# Altium footprint library WR-DSUB_Female.PcbLib: 32 footprints (part 1 of 2)
Each footprint in its own frame and in the unit in brackets; x right, y up, seen from the top. Pads: shape width x height; smd on the part's side, far side on the other; paste and mask are expansions set on the pad; w line width, h text height; cw(c..) or ccw(c..) is an arc to the next point about the centre after c.
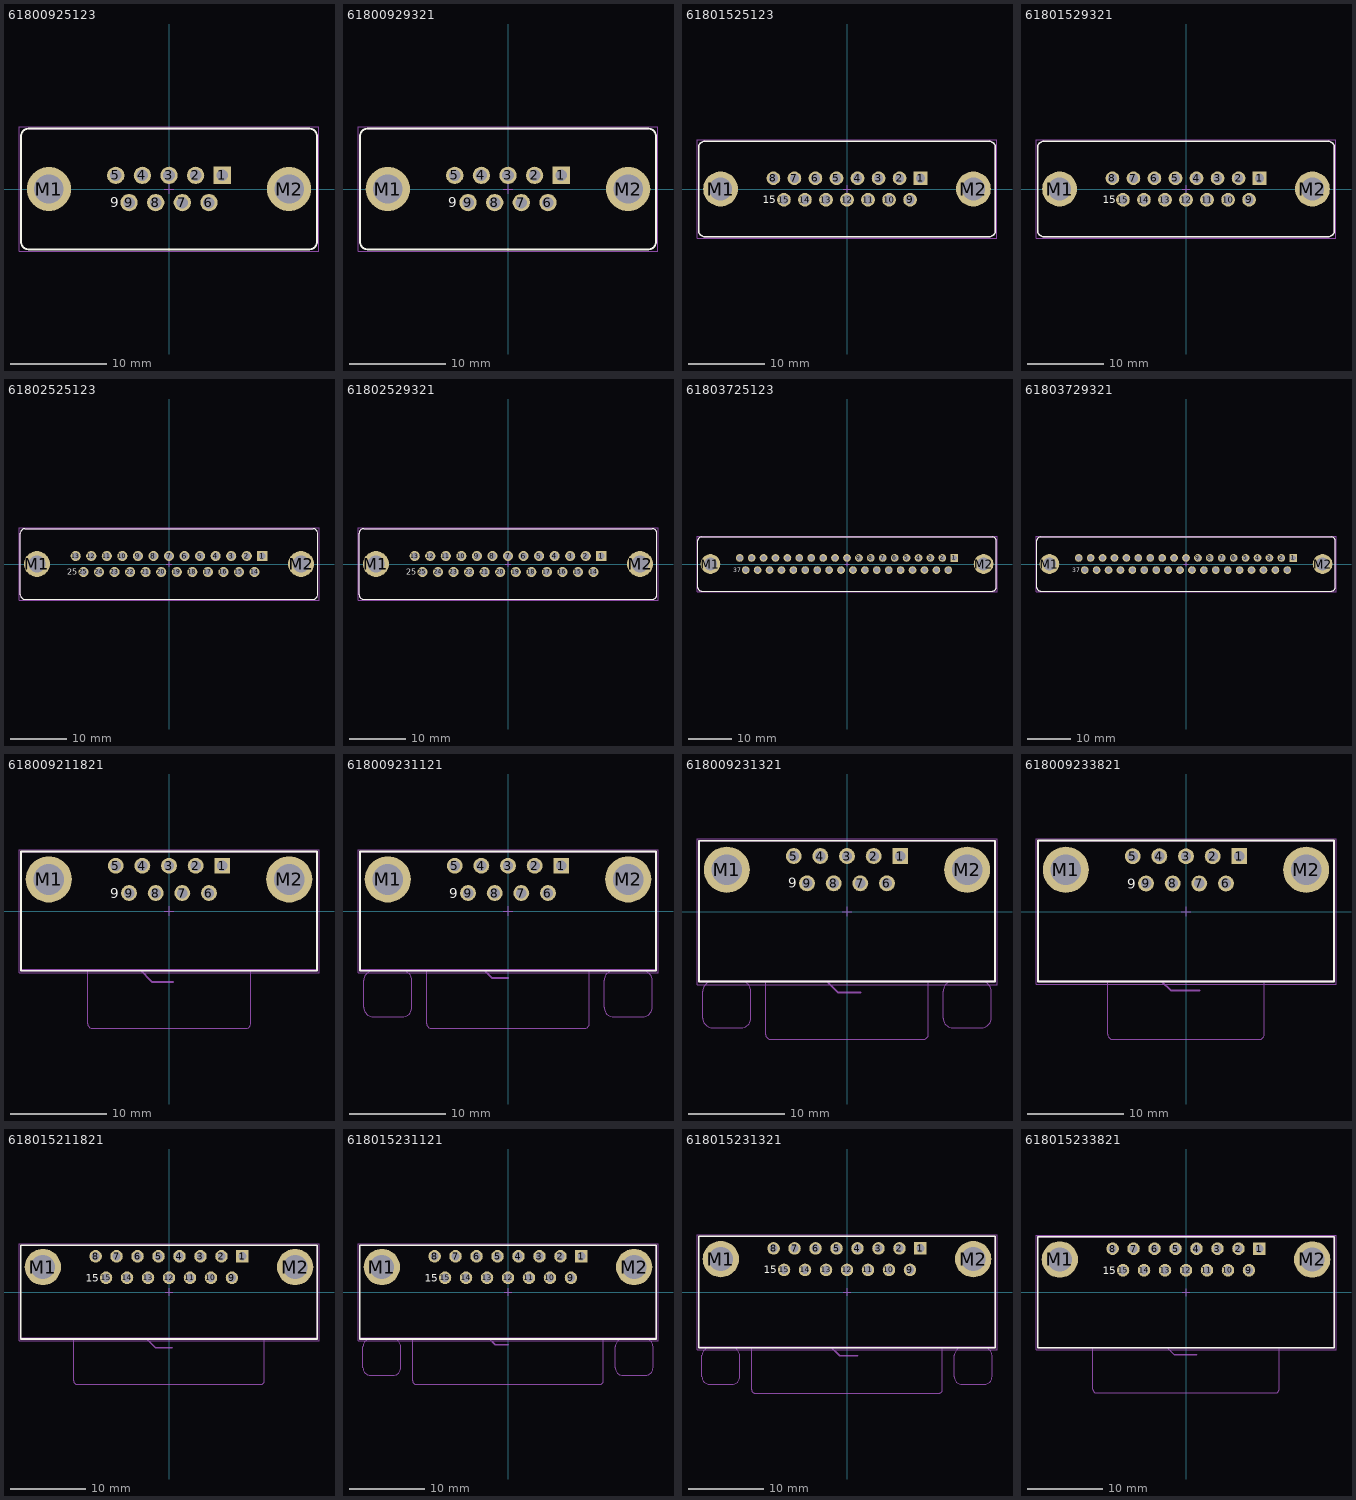
[diagram p0: the footprints below, top view; thin cyan lines are the x and y axes]

## 61800925123 [mm] "9 pins, straight"
height 10.7
pads (11):
  rect 1.8x1.8 hole 1.2: 1(5.54,1.42)
  round 1.8 hole 1.2: 2(2.77,1.42) 3(0,1.42) 4(-2.77,1.42) 5(-5.54,1.42) 6(4.155,-1.42) 7(1.385,-1.42) 8(-1.385,-1.42) 9(-4.155,-1.42)
  round 4.6 hole 3.05: M1(-12.495,0) M2(12.495,0)
Top Overlay:
  lines w0.2: -15.405,5.425 -15.405,-5.475 ccw(c-14.605,-5.475) -14.605,-6.275 14.605,-6.275 ccw(c14.605,-5.475) 15.405,-5.475 15.405,5.425 ; -15.405,5.475 cw(c-14.605,5.475) -14.605,6.275 14.605,6.275 cw(c14.605,5.475) 15.405,5.475
  text "9" at -6.1,-1.9 h1.02
Mechanical 13:
  lines w0.1: -15.405,5.425 -15.405,-5.475 ccw(c-14.605,-5.475) -14.605,-6.275 14.605,-6.275 ccw(c14.605,-5.475) 15.405,-5.475 15.405,5.425 ; -15.405,5.475 cw(c-14.605,5.475) -14.605,6.275 14.605,6.275 cw(c14.605,5.475) 15.405,5.475
Mechanical 15:
  lines w0.05: -0.5,0 0.5,0 ; 0,-0.5 0,0.5 ; -15.605,-6.475 -15.605,6.475 15.605,6.475 15.605,-6.475 -15.605,-6.475
3D body "61800925123.stp": height 12.95, standoff -3.8, extent -15.4,-6.275 15.4,6.275

## 61800929321 [mm] "Female 09p Straight With board clip & Hex screw UNC 4-40"
height 11
pads (11):
  rect 1.8x1.8 hole 1.2: 1(5.54,1.42)
  round 1.8 hole 1.2: 2(2.77,1.42) 3(0,1.42) 4(-2.77,1.42) 5(-5.54,1.42) 6(4.155,-1.42) 7(1.385,-1.42) 8(-1.385,-1.42) 9(-4.155,-1.42)
  round 4.6 hole 3.05: M1(-12.5,0) M2(12.5,0)
Top Overlay:
  lines w0.2: -15.405,-5.475 ccw(c-14.605,-5.475) -14.605,-6.275 14.605,-6.275 ccw(c14.605,-5.475) 15.405,-5.475 15.405,5.475 ccw(c14.605,5.475) 14.605,6.275 -14.605,6.275 ccw(c-14.605,5.475) -15.405,5.475 -15.405,-5.475
  text "9" at -6.2,-1.9 h1.02
Mechanical 13:
  lines w0.1: -15.405,-5.475 ccw(c-14.605,-5.475) -14.605,-6.275 14.605,-6.275 ccw(c14.605,-5.475) 15.405,-5.475 15.405,5.475 ccw(c14.605,5.475) 14.605,6.275 -14.605,6.275 ccw(c-14.605,5.475) -15.405,5.475 -15.405,-5.475
Mechanical 15:
  lines w0.05: -0.5,0 0.5,0 ; 0,-0.5 0,0.5 ; -15.605,-6.475 -15.605,6.475 15.605,6.475 15.605,-6.475 -15.605,-6.475
3D body "61800929321.stp": height 12.9, standoff -3.9, extent -15.4,-6.275 15.4,6.275

## 61801525123 [mm] "15 pins, straight"
height 10.7
pads (17):
  rect 1.8x1.8 hole 1.2: 1(9.695,1.42)
  round 1.8 hole 1.2: 2(6.925,1.42) 3(4.155,1.42) 4(1.385,1.42) 5(-1.385,1.42) 6(-4.155,1.42) 7(-6.925,1.42) 8(-9.695,1.42) 9(8.31,-1.42) 10(5.54,-1.42) 11(2.77,-1.42) 12(0,-1.42) 13(-2.77,-1.42) 14(-5.54,-1.42) 15(-8.31,-1.42)
  round 4.6 hole 3.05: M1(-16.66,0) M2(16.66,0)
Top Overlay:
  lines w0.2: -19.56,5.425 -19.56,-5.475 ccw(c-18.76,-5.475) -18.76,-6.275 18.76,-6.275 ccw(c18.76,-5.475) 19.56,-5.475 19.56,5.425 ; -19.56,5.475 cw(c-18.76,5.475) -18.76,6.275 18.76,6.275 cw(c18.76,5.475) 19.56,5.475
  text "15" at -11.1,-1.9 h1.02
Mechanical 13:
  lines w0.1: -19.56,-5.475 ccw(c-18.76,-5.475) -18.76,-6.275 18.76,-6.275 ccw(c18.76,-5.475) 19.56,-5.475 19.56,5.475 ccw(c18.76,5.475) 18.76,6.275 -18.76,6.275 ccw(c-18.76,5.475) -19.56,5.475 -19.56,-5.475
Mechanical 15:
  lines w0.05: -0.5,0 0.5,0 ; 0,-0.5 0,0.5 ; -19.77,-6.475 -19.77,6.475 19.77,6.475 19.77,-6.475 -19.77,-6.475
3D body "61801525123.stp": height 12.95, standoff -3.8, extent -19.6,-6.275 19.6,6.275

## 61801529321 [mm] "Female 15p Straight With board clip & Hex screw UNC 4-40"
height 11
pads (17):
  rect 1.8x1.8 hole 1.2: 1(9.695,1.42)
  round 1.8 hole 1.2: 2(6.925,1.42) 3(4.155,1.42) 4(1.385,1.42) 5(-1.385,1.42) 6(-4.155,1.42) 7(-6.925,1.42) 8(-9.695,1.42) 9(8.31,-1.42) 10(5.54,-1.42) 11(2.77,-1.42) 12(0,-1.42) 13(-2.77,-1.42) 14(-5.54,-1.42) 15(-8.31,-1.42)
  round 4.6 hole 3.05: M1(-16.66,0) M2(16.66,0)
Top Overlay:
  lines w0.2: -19.57,-5.475 ccw(c-18.77,-5.475) -18.77,-6.275 18.77,-6.275 ccw(c18.77,-5.475) 19.57,-5.475 19.57,5.475 ccw(c18.77,5.475) 18.77,6.275 -18.77,6.275 ccw(c-18.77,5.475) -19.57,5.475 -19.57,-5.475
  text "15" at -11,-1.9 h1.02
Mechanical 13:
  lines w0.1: -19.57,-5.475 ccw(c-18.77,-5.475) -18.77,-6.275 18.77,-6.275 ccw(c18.77,-5.475) 19.57,-5.475 19.57,5.475 ccw(c18.77,5.475) 18.77,6.275 -18.77,6.275 ccw(c-18.77,5.475) -19.57,5.475 -19.57,-5.475
Mechanical 15:
  lines w0.05: -0.5,0 0.5,0 ; 0,-0.5 0,0.5 ; -19.77,-6.475 -19.77,6.475 19.77,6.475 19.77,-6.475 -19.77,-6.475
3D body "61801529321.stp": height 12.9, standoff -3.9, extent -19.6,-6.275 19.6,6.275

## 61802525123 [mm] "25 pins, straight"
height 10.7
pads (27):
  rect 1.8x1.8 hole 1.2: 1(16.62,1.42)
  round 1.8 hole 1.2: 2(13.85,1.42) 3(11.08,1.42) 4(8.31,1.42) 5(5.54,1.42) 6(2.77,1.42) 7(0,1.42) 8(-2.77,1.42) 9(-5.54,1.42) 10(-8.31,1.42) 11(-11.08,1.42) 12(-13.85,1.42) 13(-16.62,1.42) 14(15.235,-1.42) 15(12.465,-1.42) 16(9.695,-1.42) 17(6.925,-1.42) 18(4.155,-1.42) 19(1.385,-1.42) 20(-1.385,-1.42) 21(-4.155,-1.42) 22(-6.925,-1.42) 23(-9.695,-1.42) 24(-12.465,-1.42) 25(-15.235,-1.42)
  round 4.6 hole 3.05: M1(-23.52,0) M2(23.52,0)
Top Overlay:
  lines w0.2: -26.485,-5.475 ccw(c-25.685,-5.475) -25.685,-6.275 25.685,-6.275 ccw(c25.685,-5.475) 26.485,-5.475 26.485,5.475 ccw(c25.685,5.475) 25.685,6.275 -25.685,6.275 ccw(c-25.685,5.475) -26.485,5.475 -26.485,-5.475
  text "25" at -18.1,-1.9 h1.02
Mechanical 13:
  lines w0.1: -26.485,-5.475 ccw(c-25.685,-5.475) -25.685,-6.275 25.685,-6.275 ccw(c25.685,-5.475) 26.485,-5.475 26.485,5.475 ccw(c25.685,5.475) 25.685,6.275 -25.685,6.275 ccw(c-25.685,5.475) -26.485,5.475 -26.485,-5.475
Mechanical 15:
  lines w0.05: -0.5,0 0.5,0 ; 0,-0.5 0,0.5 ; -26.72,-6.475 26.72,-6.475 26.72,6.475 -26.72,6.475 -26.72,-6.475
3D body "61802525123.stp": height 12.95, standoff -3.8, extent -26.525,-6.275 26.525,6.275

## 61802529321 [mm] "Female 25p Straight With board clip & Hex screw UNC 4-40"
height 11
pads (27):
  rect 1.8x1.8 hole 1.2: 1(16.62,1.42)
  round 1.8 hole 1.2: 2(13.85,1.42) 3(11.08,1.42) 4(8.31,1.42) 5(5.54,1.42) 6(2.77,1.42) 7(0,1.42) 8(-2.77,1.42) 9(-5.54,1.42) 10(-8.31,1.42) 11(-11.08,1.42) 12(-13.85,1.42) 13(-16.62,1.42) 14(15.235,-1.42) 15(12.465,-1.42) 16(9.695,-1.42) 17(6.925,-1.42) 18(4.155,-1.42) 19(1.385,-1.42) 20(-1.385,-1.42) 21(-4.155,-1.42) 22(-6.925,-1.42) 23(-9.695,-1.42) 24(-12.465,-1.42) 25(-15.235,-1.42)
  round 4.6 hole 3.05: M1(-23.52,0) M2(23.52,0)
Top Overlay:
  lines w0.2: -26.52,-5.475 ccw(c-25.72,-5.475) -25.72,-6.275 25.72,-6.275 ccw(c25.72,-5.475) 26.52,-5.475 26.52,5.475 ccw(c25.72,5.475) 25.72,6.275 -25.72,6.275 ccw(c-25.72,5.475) -26.52,5.475 -26.52,-5.475
  text "25" at -18.1,-1.9 h1.02
Mechanical 13:
  lines w0.1: -26.52,-5.475 ccw(c-25.72,-5.475) -25.72,-6.275 25.72,-6.275 ccw(c25.72,-5.475) 26.52,-5.475 26.52,5.475 ccw(c25.72,5.475) 25.72,6.275 -25.72,6.275 ccw(c-25.72,5.475) -26.52,5.475 -26.52,-5.475
Mechanical 15:
  lines w0.05: -0.5,0 0.5,0 ; 0,-0.5 0,0.5 ; -26.72,-6.475 -26.72,6.475 26.72,6.475 26.72,-6.475 -26.72,-6.475
3D body "61802529321.stp": height 12.9, standoff -3.9, extent -26.525,-6.275 26.525,6.275

## 61803725123 [mm] "37 pins, straight"
height 10.7
pads (39):
  rect 1.8x1.8 hole 1.2: 1(24.93,1.42)
  round 1.8 hole 1.2: 2(22.16,1.42) 3(19.39,1.42) 4(16.62,1.42) 5(13.85,1.42) 6(11.08,1.42) 7(8.31,1.42) 8(5.54,1.42) 9(2.77,1.42) 10(0,1.42) 11(-2.77,1.42) 12(-5.54,1.42) 13(-8.31,1.42) 14(-11.08,1.42) 15(-13.85,1.42) 16(-16.62,1.42) 17(-19.39,1.42) 18(-22.16,1.42) 19(-24.93,1.42) 20(23.545,-1.42) 21(20.775,-1.42) 22(18.005,-1.42) 23(15.235,-1.42) 24(12.465,-1.42) 25(9.695,-1.42) 26(6.925,-1.42) 27(4.155,-1.42) 28(1.385,-1.42) 29(-1.385,-1.42) 30(-4.155,-1.42) 31(-6.925,-1.42) 32(-9.695,-1.42) 33(-12.465,-1.42) 34(-15.235,-1.42) 35(-18.005,-1.42) 36(-20.775,-1.42) 37(-23.545,-1.42)
  round 4.6 hole 3.05: M1(-31.75,0) M2(31.75,0)
Top Overlay:
  lines w0.2: -34.66,-5.475 ccw(c-33.86,-5.475) -33.86,-6.275 33.86,-6.275 ccw(c33.86,-5.475) 34.66,-5.475 34.66,5.475 ccw(c33.86,5.475) 33.86,6.275 -33.86,6.275 ccw(c-33.86,5.475) -34.66,5.475 -34.66,-5.475
  text "37" at -26.41,-1.9 h1.02
Mechanical 13:
  lines w0.1: -34.66,-5.475 ccw(c-33.86,-5.475) -33.86,-6.275 33.86,-6.275 ccw(c33.86,-5.475) 34.66,-5.475 34.66,5.475 ccw(c33.86,5.475) 33.86,6.275 -33.86,6.275 ccw(c-33.86,5.475) -34.66,5.475 -34.66,-5.475
Mechanical 15:
  lines w0.05: -0.5,0 0.5,0 ; 0,-0.5 0,0.5 ; -34.86,-6.475 34.86,-6.475 34.86,6.475 -34.86,6.475 -34.86,-6.475
3D body "61803725123.stp": height 12.95, standoff -3.8, extent -34.7,-6.275 34.7,6.275

## 61803729321 [mm] "Female 37p Straight With board clip & Hex screw UNC 4-40"
height 11
pads (39):
  rect 1.8x1.8 hole 1.2: 1(24.93,1.42)
  round 1.8 hole 1.2: 2(22.16,1.42) 3(19.39,1.42) 4(16.62,1.42) 5(13.85,1.42) 6(11.08,1.42) 7(8.31,1.42) 8(5.54,1.42) 9(2.77,1.42) 10(0,1.42) 11(-2.77,1.42) 12(-5.54,1.42) 13(-8.31,1.42) 14(-11.08,1.42) 15(-13.85,1.42) 16(-16.62,1.42) 17(-19.39,1.42) 18(-22.16,1.42) 19(-24.93,1.42) 20(23.545,-1.42) 21(20.775,-1.42) 22(18.005,-1.42) 23(15.235,-1.42) 24(12.465,-1.42) 25(9.695,-1.42) 26(6.925,-1.42) 27(4.155,-1.42) 28(1.385,-1.42) 29(-1.385,-1.42) 30(-4.155,-1.42) 31(-6.925,-1.42) 32(-9.695,-1.42) 33(-12.465,-1.42) 34(-15.235,-1.42) 35(-18.005,-1.42) 36(-20.775,-1.42) 37(-23.545,-1.42)
  round 4.6 hole 3.05: M1(-31.75,0) M2(31.75,0)
Top Overlay:
  lines w0.2: -34.66,-5.475 ccw(c-33.86,-5.475) -33.86,-6.275 33.86,-6.275 ccw(c33.86,-5.475) 34.66,-5.475 34.66,5.475 ccw(c33.86,5.475) 33.86,6.275 -33.86,6.275 ccw(c-33.86,5.475) -34.66,5.475 -34.66,-5.475
  text "37" at -26.41,-1.9 h1.02
Mechanical 13:
  lines w0.1: -34.66,-5.475 ccw(c-33.86,-5.475) -33.86,-6.275 33.86,-6.275 ccw(c33.86,-5.475) 34.66,-5.475 34.66,5.475 ccw(c33.86,5.475) 33.86,6.275 -33.86,6.275 ccw(c-33.86,5.475) -34.66,5.475 -34.66,-5.475
Mechanical 15:
  lines w0.05: -0.5,0 0.5,0 ; 0,-0.5 0,0.5 ; -34.86,-6.475 34.86,-6.475 34.86,6.475 -34.86,6.475 -34.86,-6.475
3D body "61803729321.stp": height 12.9, standoff -3.9, extent -34.7,-6.275 34.7,6.275

## 618009211821 [mm] "09p 8.08mm bracket, board lock & UNC4-40 Rivet without hex screw"
height 12.5
pads (11):
  rect 1.65x1.65 hole 1.09: 1(5.54,4.72)
  round 1.65 hole 1.09: 2(2.77,4.72) 3(0,4.72) 4(-2.77,4.72) 5(-5.54,4.72) 6(4.155,1.88) 7(1.385,1.88) 8(-1.385,1.88) 9(-4.155,1.88)
  round 4.8 hole 3.2: M1(-12.5,3.3) M2(12.5,3.3)
Top Overlay:
  lines w0.2: -15.4,-6.2 15.4,-6.2 15.4,6.2 -15.4,6.2 -15.4,-6.2
  text "9" at -6.1,1.35 h1.02
Mechanical 2:
  lines w0.2: -15.4,-6.12 15.4,-6.12 ; -3,-6.12 -1.77,-7.35 0.4,-7.35
  text "PCB Edge" at 0.7,-8.05 h1.02
Mechanical 13:
  lines w0.1: -8.45,-6.2 -8.45,-11.7 ccw(c-7.95,-11.7) -7.95,-12.2 ; -8,-12.2 8,-12.2 ccw(c8,-11.7) 8.5,-11.7 8.5,-6.2 ; -15.4,-6.2 -15.4,6.2 15.4,6.2 15.4,-6.2 -15.4,-6.2
Mechanical 15:
  lines w0.05: -0.5,0 0.5,0 ; 0,-0.5 0,0.5 ; -15.6,-6.4 -15.6,6.4 15.6,6.4 15.6,-6.4 -15.6,-6.4
3D body "618009211821.stp": height 12.55, standoff -3.95, extent -15.4,-12.2 15.4,6.2

## 618009231121 [mm] "9 pins, right angled, 8.08mm, with hex screw"
height 12.5
pads (11):
  rect 1.65x1.65 hole 1.09: 1(5.54,4.72)
  round 1.65 hole 1.09: 2(2.77,4.72) 3(0,4.72) 4(-2.77,4.72) 5(-5.54,4.72) 6(4.155,1.88) 7(1.385,1.88) 8(-1.385,1.88) 9(-4.155,1.88)
  round 4.8 hole 3.2: M1(-12.5,3.3) M2(12.5,3.3)
Top Overlay:
  lines w0.2: -15.4,-6.2 -15.4,6.2 15.4,6.2 15.4,-6.2 -15.4,-6.2
  text "9" at -6.1,1.35 h1.02
Mechanical 2:
  lines w0.2: -15.4,-6.12 15.4,-6.12 ; -2.5,-6.12 -1.67,-6.95 0,-6.95
  text "PCB Edge" at 0.4,-7.55 h1.02
Mechanical 13:
  lines w0.1: -14,-6.2 ccw(c-14,-7.2) -15,-7.2 -15,-10 ccw(c-14,-10) -14,-11 -11,-11 ccw(c-11,-10) -10,-10 -10,-7.2 ccw(c-11,-7.2) -11,-6.2 ; -8.45,-6.2 -8.45,-11.7 ccw(c-7.95,-11.7) -7.95,-12.2 7.95,-12.2 ; 8.45,-6.2 8.45,-11.7 cw(c7.95,-11.7) 7.95,-12.2 ; 11,-6.2 ccw(c11,-7.2) 10,-7.2 10,-10 ccw(c11,-10) 11,-11 14,-11 ccw(c14,-10) 15,-10 15,-7.2 ccw(c14,-7.2) 14,-6.2 ; 7.95,-12.2 7.95,-12.2 ; -15.4,-6.2 15.4,-6.2 15.4,6.2 -15.4,6.2 -15.4,-6.2
Mechanical 15:
  lines w0.05: -0.5,0 0.5,0 ; 0,-0.5 0,0.5 ; -15.6,-6.4 -15.6,6.4 15.6,6.4 15.6,-6.4 -15.6,-6.4
3D body "618009231121.stp": height 12.55, standoff -3.95, extent -15.4,-12.2 15.4,6.2

## 618009231321 [mm] "9 pins, right angled, 10.3mm, with hex screw"
height 12.5
pads (11):
  rect 1.65x1.65 hole 1.09: 1(5.54,5.78)
  round 1.65 hole 1.09: 2(2.77,5.78) 3(0,5.78) 4(-2.77,5.78) 5(-5.54,5.78) 6(4.155,2.94) 7(1.385,2.94) 8(-1.385,2.94) 9(-4.155,2.94)
  round 4.8 hole 3.2: M1(-12.495,4.36) M2(12.495,4.36)
Top Overlay:
  lines w0.2: -15.4,-7.28 -15.4,7.37 15.4,7.37 15.4,-7.28 -15.4,-7.28
  text "9" at -6.1,2.5 h1.02
Mechanical 2:
  lines w0.2: -15.4,-7.26 15.4,-7.26 ; -2.1,-7.26 -0.96,-8.4 1.4,-8.4
  text "PCB Edge" at 1.8,-8.8 h1.02
Mechanical 13:
  lines w0.1: -14,-7.28 ccw(c-14,-8.28) -15,-8.28 -15,-11.08 ccw(c-14,-11.08) -14,-12.08 -11,-12.08 ccw(c-11,-11.08) -10,-11.08 -10,-8.28 ccw(c-11,-8.28) -11,-7.28 ; -8.45,-7.28 -8.45,-12.78 ccw(c-7.95,-12.78) -7.95,-13.28 7.95,-13.28 ; 8.45,-7.28 8.45,-12.78 cw(c7.95,-12.78) 7.95,-13.28 ; 11,-7.28 ccw(c11,-8.28) 10,-8.28 10,-11.08 ccw(c11,-11.08) 11,-12.08 14,-12.08 ccw(c14,-11.08) 15,-11.08 15,-8.28 ccw(c14,-8.28) 14,-7.28 ; 7.95,-13.28 7.95,-13.28 ; -15.4,-7.28 15.4,-7.28 15.4,7.37 -15.4,7.37 -15.4,-7.28
Mechanical 15:
  lines w0.05: -0.5,0 0.5,0 ; 0,-0.5 0,0.5 ; -15.6,-7.59 15.6,-7.59 15.6,7.59 -15.6,7.59 -15.6,-7.59
3D body "618009231321.stp": height 12.57, standoff -3.77, extent -15.408,-13.28 15.408,7.37

## 618009233821 [mm] "09p 10.3mm bracket, board lock & UNC4-40 Rivet without hex screw"
height 12.5
pads (11):
  rect 1.65x1.65 hole 1.09: 1(5.54,5.765)
  round 1.65 hole 1.09: 2(2.77,5.765) 3(0,5.765) 4(-2.77,5.765) 5(-5.54,5.765) 6(4.155,2.925) 7(1.385,2.925) 8(-1.385,2.925) 9(-4.155,2.925)
  round 4.8 hole 3.2: M1(-12.495,4.345) M2(12.495,4.345)
Top Overlay:
  lines w0.2: -15.4,-7.275 15.4,-7.275 15.4,7.375 -15.4,7.375 -15.4,-7.275
  text "9" at -6.1,2.4 h1.02
Mechanical 2:
  lines w0.2: -15.4,-7.275 15.4,-7.275 ; -2.5,-7.275 -1.575,-8.2 1.4,-8.2
  text "PCB Edge" at 1.8,-8.7 h1.02
Mechanical 13:
  lines w0.1: -8.15,-7.275 -8.15,-12.775 ccw(c-7.65,-12.775) -7.65,-13.275 7.65,-13.275 ; 8.15,-7.275 8.15,-12.775 cw(c7.65,-12.775) 7.65,-13.275 ; 7.65,-13.275 7.65,-13.275 ; -15.4,-7.275 -15.4,7.375 15.4,7.375 15.4,-7.275 -15.4,-7.275
Mechanical 15:
  lines w0.05: -0.5,0 0.5,0 ; 0,-0.5 0,0.5 ; -15.6,-7.575 -15.6,7.575 15.6,7.575 15.6,-7.575 -15.6,-7.575
3D body "618009233821.stp": height 12.57, standoff -3.77, extent -15.408,-13.275 15.408,7.375

## 618015211821 [mm] "15p 8.08mm bracket, board lock & UNC4-40 Rivet without hex screw"
height 12.5
pads (17):
  rect 1.65x1.65 hole 1.09: 1(9.695,4.72)
  round 1.65 hole 1.09: 2(6.925,4.72) 3(4.155,4.72) 4(1.385,4.72) 5(-1.385,4.72) 6(-4.155,4.72) 7(-6.925,4.72) 8(-9.695,4.72) 9(8.31,1.88) 10(5.54,1.88) 11(2.77,1.88) 12(0,1.88) 13(-2.77,1.88) 14(-5.54,1.88) 15(-8.31,1.88)
  round 4.8 hole 3.2: M1(-16.65,3.3) M2(16.65,3.3)
Top Overlay:
  lines w0.2: -19.6,-6.2 19.6,-6.2 19.6,6.2 -19.6,6.2 -19.6,-6.2
  text "15" at -11,1.35 h1.02
Mechanical 2:
  lines w0.2: -19.6,-6.12 19.6,-6.12 ; -3,-6.12 -1.77,-7.35 0.4,-7.35
  text "PCB Edge" at 0.7,-8.05 h1.02
Mechanical 13:
  lines w0.1: -12.6,-6.2 -12.6,-11.7 ccw(c-12.1,-11.7) -12.1,-12.2 ; -12.15,-12.2 12.1,-12.2 ccw(c12.1,-11.7) 12.6,-11.7 12.6,-6.2 ; -19.6,-6.2 -19.6,6.2 19.6,6.2 19.6,-6.2 -19.6,-6.2
Mechanical 15:
  lines w0.05: -0.5,0 0.5,0 ; 0,-0.5 0,0.5 ; -19.8,-6.4 19.8,-6.4 19.8,6.4 -19.8,6.4 -19.8,-6.4
3D body "618015211821.stp": height 12.55, standoff -3.95, extent -19.6,-12.2 19.6,6.2

## 618015231121 [mm] "15 pins, right angled, 8.08mm, with hex screw"
height 12.5
pads (17):
  rect 1.65x1.65 hole 1.09: 1(9.695,4.72)
  round 1.65 hole 1.09: 2(6.925,4.72) 3(4.155,4.72) 4(1.385,4.72) 5(-1.385,4.72) 6(-4.155,4.72) 7(-6.925,4.72) 8(-9.695,4.72) 9(8.31,1.88) 10(5.54,1.88) 11(2.77,1.88) 12(0,1.88) 13(-2.77,1.88) 14(-5.54,1.88) 15(-8.31,1.88)
  round 4.8 hole 3.2: M1(-16.65,3.3) M2(16.65,3.3)
Top Overlay:
  lines w0.2: -19.6,-6.2 19.6,-6.2 19.6,6.2 -19.6,6.2 -19.6,-6.2
  text "15" at -11,1.35 h1.02
Mechanical 2:
  lines w0.2: -19.6,-6.12 19.6,-6.12 ; -2.5,-6.12 -1.67,-6.95 0,-6.95
  text "PCB Edge" at 0.4,-7.55 h1.02
Mechanical 13:
  lines w0.1: -18.15,-6.2 ccw(c-18.15,-7.2) -19.15,-7.2 -19.15,-10 ccw(c-18.15,-10) -18.15,-11 -15.15,-11 ccw(c-15.15,-10) -14.15,-10 -14.15,-7.2 ccw(c-15.15,-7.2) -15.15,-6.2 ; -12.6,-6.2 -12.6,-11.7 ccw(c-12.1,-11.7) -12.1,-12.2 12.1,-12.2 ccw(c12.1,-11.7) 12.6,-11.7 12.6,-6.2 ; 15.15,-6.2 ccw(c15.15,-7.2) 14.15,-7.2 14.15,-10 ccw(c15.15,-10) 15.15,-11 18.15,-11 ccw(c18.15,-10) 19.15,-10 19.15,-7.2 ccw(c18.15,-7.2) 18.15,-6.2 ; -19.6,-6.2 19.6,-6.2 19.6,6.2 -19.6,6.2 -19.6,-6.2 ; 3.8,-12.2 3.8,-12.2
Mechanical 15:
  lines w0.05: -0.5,0 0.5,0 ; 0,-0.5 0,0.5 ; -19.8,-6.4 -19.8,6.4 19.8,6.4 19.8,-6.4 -19.8,-6.4
3D body "618015231121.stp": height 12.55, standoff -3.95, extent -19.6,-12.2 19.6,6.2

## 618015231321 [mm] "15 pins, right angled, 10.3mm, with hex screw"
height 12.5
pads (17):
  rect 1.65x1.65 hole 1.09: 1(9.695,5.78)
  round 1.65 hole 1.09: 2(6.925,5.78) 3(4.155,5.78) 4(1.385,5.78) 5(-1.385,5.78) 6(-4.155,5.78) 7(-6.925,5.78) 8(-9.695,5.78) 9(8.31,2.94) 10(5.54,2.94) 11(2.77,2.94) 12(0,2.94) 13(-2.77,2.94) 14(-5.54,2.94) 15(-8.31,2.94)
  round 4.8 hole 3.2: M1(-16.66,4.36) M2(16.66,4.36)
Top Overlay:
  lines w0.2: -19.6,-7.36 -19.6,7.37 19.6,7.37 19.6,-7.36 -19.6,-7.36
  text "15" at -11,2.5 h1.02
Mechanical 2:
  lines w0.2: -19.6,-7.26 19.6,-7.26 ; -2.1,-7.26 -0.96,-8.4 1.4,-8.4
  text "PCB Edge" at 1.8,-8.8 h1.02
Mechanical 13:
  lines w0.1: -18.15,-7.36 ccw(c-18.15,-8.36) -19.15,-8.36 -19.15,-11.16 ccw(c-18.15,-11.16) -18.15,-12.16 -15.15,-12.16 ccw(c-15.15,-11.16) -14.15,-11.16 -14.15,-8.36 ccw(c-15.15,-8.36) -15.15,-7.36 ; -12.6,-7.36 -12.6,-12.86 ccw(c-12.1,-12.86) -12.1,-13.36 12.1,-13.36 ; 12.6,-7.36 12.6,-12.86 cw(c12.1,-12.86) 12.1,-13.36 ; 15.15,-7.36 ccw(c15.15,-8.36) 14.15,-8.36 14.15,-11.16 ccw(c15.15,-11.16) 15.15,-12.16 18.15,-12.16 ccw(c18.15,-11.16) 19.15,-11.16 19.15,-8.36 ccw(c18.15,-8.36) 18.15,-7.36 ; 12.1,-13.36 12.1,-13.36 ; -19.6,-7.36 19.6,-7.36 19.6,7.37 -19.6,7.37 -19.6,-7.36
Mechanical 15:
  lines w0.05: -0.5,0 0.5,0 ; 0,-0.5 0,0.5 ; -19.8,-7.59 19.8,-7.59 19.8,7.59 -19.8,7.59 -19.8,-7.59
3D body "618015231321.stp": height 12.57, standoff -3.77, extent -19.575,-13.28 19.575,7.37

## 618015233821 [mm] "15p 10.3mm bracket, board lock & UNC4-40 Rivet without hex screw"
height 12.5
pads (17):
  rect 1.65x1.65 hole 1.09: 1(9.695,5.765)
  round 1.65 hole 1.09: 2(6.925,5.765) 3(4.155,5.765) 4(1.385,5.765) 5(-1.385,5.765) 6(-4.155,5.765) 7(-6.925,5.765) 8(-9.695,5.765) 9(8.31,2.925) 10(5.54,2.925) 11(2.77,2.925) 12(0,2.925) 13(-2.77,2.925) 14(-5.54,2.925) 15(-8.31,2.925)
  round 4.8 hole 3.2: M1(-16.66,4.345) M2(16.66,4.345)
Top Overlay:
  lines w0.2: -19.6,-7.275 19.6,-7.275 19.6,7.375 -19.6,7.375 -19.6,-7.275
  text "15" at -11,2.4 h1.02
Mechanical 2:
  lines w0.2: -19.6,-7.275 19.6,-7.275 ; -2.5,-7.275 -1.575,-8.2 1.4,-8.2
  text "PCB Edge" at 1.8,-8.7 h1.02
Mechanical 13:
  lines w0.1: -12.3,-7.275 -12.3,-12.775 ccw(c-11.8,-12.775) -11.8,-13.275 11.8,-13.275 ; 12.3,-7.275 12.3,-12.775 cw(c11.8,-12.775) 11.8,-13.275 ; 11.8,-13.275 11.8,-13.275 ; -19.6,-7.275 -19.6,7.375 19.6,7.375 19.6,-7.275 -19.6,-7.275
Mechanical 15:
  lines w0.05: -0.5,0 0.5,0 ; 0,-0.5 0,0.5 ; -19.8,-7.575 -19.8,7.575 19.8,7.575 19.8,-7.575 -19.8,-7.575
3D body "618015233821.stp": height 12.57, standoff -3.77, extent -19.575,-13.275 19.575,7.375